# Altium footprint library SILICA_PCBLIB.PcbLib: 161 footprints (part 1 of 11)
Each footprint in its own frame and in the unit in brackets; x right, y up, seen from the top. Pads: shape width x height; smd on the part's side, far side on the other; paste and mask are expansions set on the pad; w line width, h text height; cw(c..) or ccw(c..) is an arc to the next point about the centre after c.
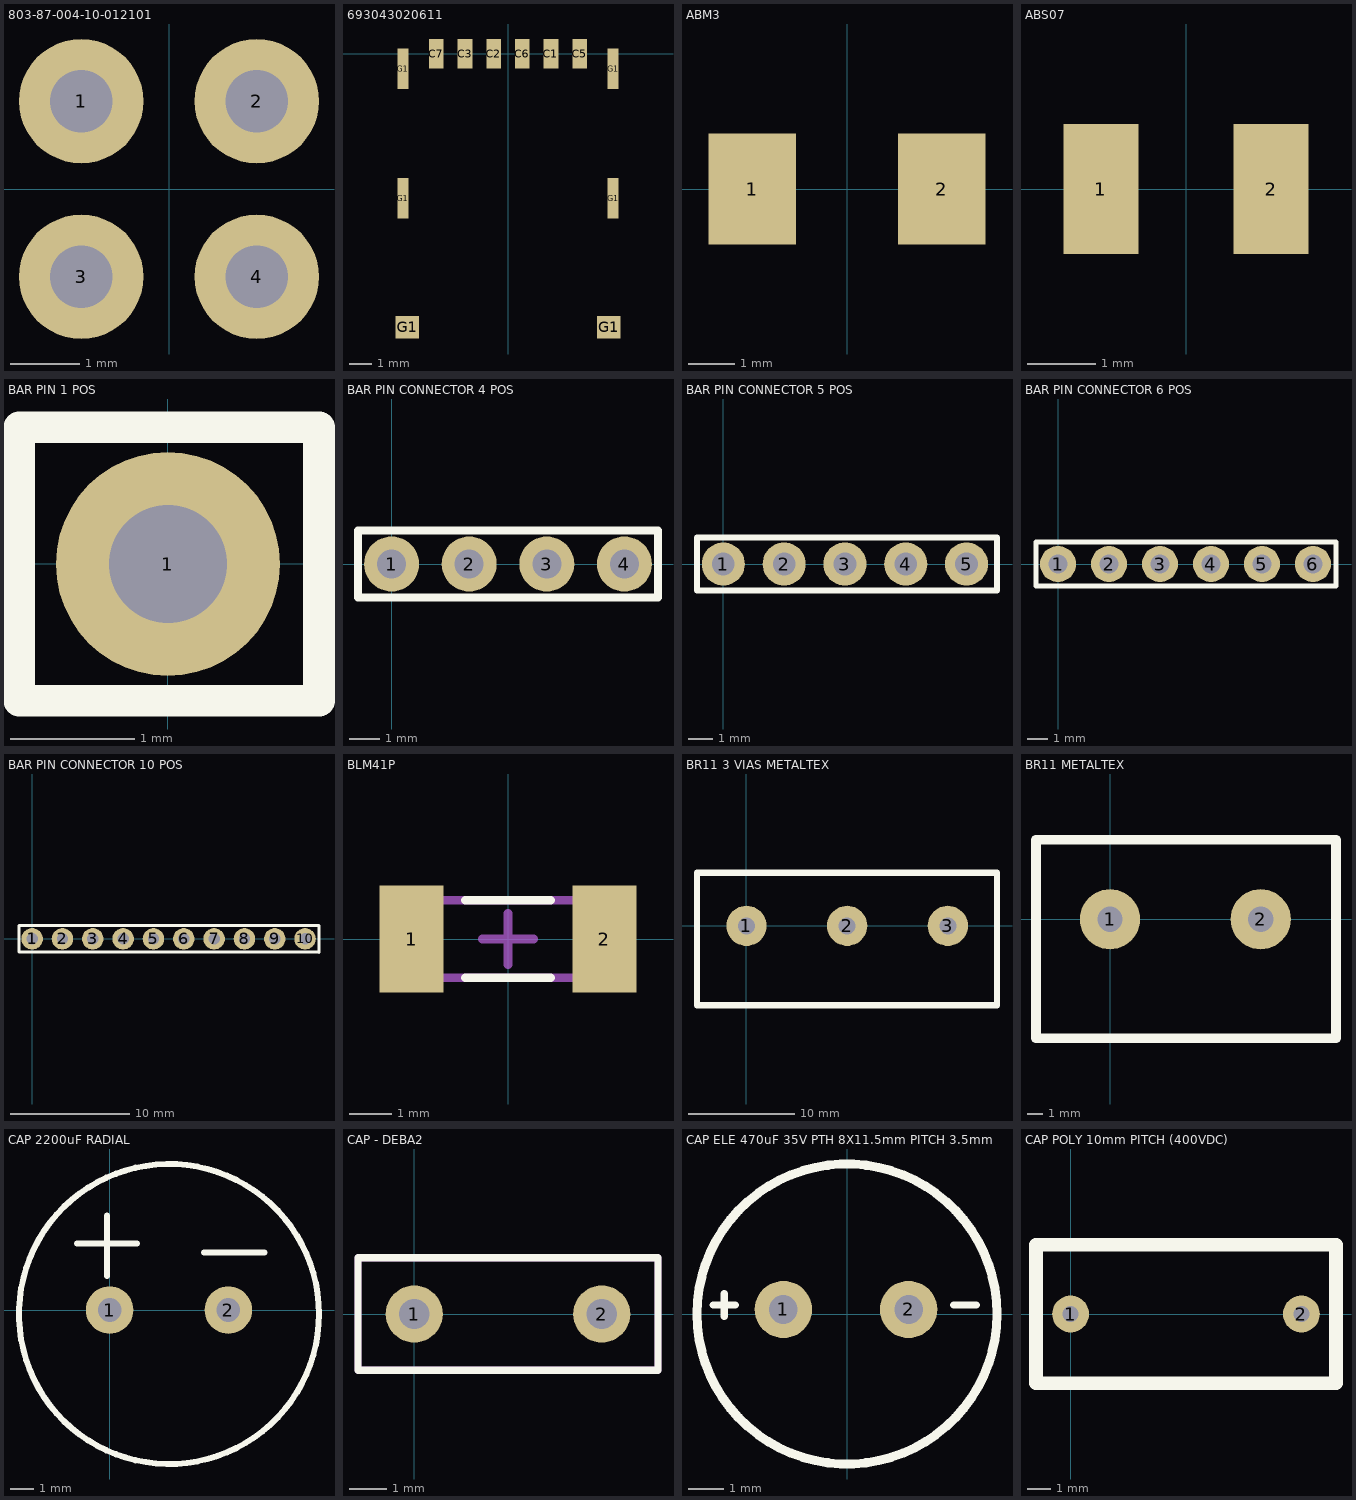
[diagram p0: the footprints below, top view; thin cyan lines are the x and y axes]

## 803-87-004-10-012101 [mm]
pads (4):
  round 1.8 hole 0.9: 1(-1.27,1.27) 2(1.27,1.27) 3(-1.27,-1.27) 4(1.27,-1.27)
3D body "pcb_connector_803-87-004-10-268101.stp": height 2.8, standoff -2.9, extent -2.527,-2.527 2.553,2.553

## 693043020611 [mm] "NANO SIM - PUSH & PULL TYPE - 6 PINS"
height 1.3
pads (12):
  rect 0.65x1.3 smd: C1(1.905,0) C2(-0.635,0) C3(-1.905,0) C5(3.175,0) C6(0.635,0) C7(-3.175,0)
  rect 0.48x1.8 smd: G1(-4.66,-6.42) G1(-4.66,-0.67) G1(4.66,-6.42) G1(4.66,-0.67)
  rect 1.03x1 smd: G1(-4.465,-12.14) G1(4.465,-12.14)
3D body "STEP-693043020611-rev1.stp": height 1.1, standoff -0.11, extent -4.75,-12.388 4.75,0.113

## ABM3 [mm] "MINIATURE CERAMIC SMD CRYSTAL"
height 1.3
pads (2):
  rect 1.9x2.4 smd: 1(-2.05,0) 2(2.05,0)
3D body "ABM3.STEP": height 1.3, standoff 0, extent -2.5,-1.6 2.5,1.6

## ABS07 [mm] "MINIATURE CERAMIC SMD CRYSTAL"
height 0.9
pads (2):
  rect 1.1x1.9 smd: 1(-1.25,0) 2(1.25,0)
3D body "ABS07.STEP": height 0.89, standoff 0, extent -1.6,-0.749 1.6,0.749

## BAR PIN 1 POS [mm] "BAR PIN 1 POS"
pads (1):
  round 1.8 hole 0.95: 1(0,0)
Top Overlay:
  lines w0.254: -1.196,-1.1 -1.196,1.1 1.214,1.1 1.214,-1.1 -1.196,-1.1
3D body: height 0, standoff -2, extent -0.466,-0.469 0.47,0.469
3D body: height 3.9, standoff 0, extent -0.466,-0.469 0.47,0.469
3D body: height 1.5, standoff 0, extent -1.065,-1.2 1.119,1.002

## BAR PIN CONNECTOR 4 POS [mm] "BAR PIN CONNECTOR 4 POS"
pads (4):
  round 1.8 hole 0.95: 1(0,0) 2(2.54,0) 3(5.08,0) 4(7.62,0)
Top Overlay:
  lines w0.254: 8.7,-1.1 -1.1,-1.1 -1.1,1.1 8.72,1.1 8.72,-1.1
3D body: height 3.9, standoff 0, extent 7.144,-0.469 8.08,0.469
3D body: height 1.5, standoff 0, extent 1.475,-1.2 6.215,1
3D body: height 3.9, standoff 0, extent -0.466,-0.469 0.47,0.469
3D body: height 0, standoff -2, extent -0.466,-0.469 0.47,0.469
3D body: height 3.9, standoff 0, extent 2.074,-0.469 3.01,0.469
3D body: height 0, standoff -2, extent 2.074,-0.469 3.01,0.469
3D body: height 0, standoff -2, extent 4.614,-0.469 5.55,0.469
3D body: height 3.9, standoff 0, extent 4.604,-0.469 5.54,0.469
3D body: height 1.5, standoff 0, extent -1.065,-1.2 3.675,1
3D body: height 0, standoff -2, extent 7.154,-0.469 8.09,0.469
3D body: height 1.5, standoff 0, extent 4.015,-1.2 8.755,1

## BAR PIN CONNECTOR 5 POS [mm] "BAR PIN CONNECTOR 6 POS"
pads (5):
  round 1.8 hole 0.95: 1(0,0) 2(2.54,0) 3(5.08,0) 4(7.62,0) 5(10.16,0)
Top Overlay:
  lines w0.254: -1.1,-1.1 11.433,-1.1 11.433,1.1 -1.1,1.1 -1.1,-1.1
3D body: height 3.9, standoff 0, extent 7.144,-0.469 8.08,0.469
3D body: height 1.5, standoff 0, extent 1.475,-1.2 6.215,1
3D body: height 3.9, standoff 0, extent -0.466,-0.469 0.47,0.469
3D body: height 0, standoff -2, extent -0.466,-0.469 0.47,0.469
3D body: height 3.9, standoff 0, extent 2.074,-0.469 3.01,0.469
3D body: height 0, standoff -2, extent 2.074,-0.469 3.01,0.469
3D body: height 0, standoff -2, extent 4.614,-0.469 5.55,0.469
3D body: height 3.9, standoff 0, extent 4.604,-0.469 5.54,0.469
3D body: height 1.5, standoff 0, extent -1.065,-1.2 3.675,1
3D body: height 0, standoff -2, extent 7.154,-0.469 8.09,0.469
3D body: height 0, standoff -2, extent 9.694,-0.469 10.63,0.469
3D body: height 3.9, standoff 0, extent 9.684,-0.469 10.62,0.469
3D body: height 1.5, standoff 0, extent 4.015,-1.2 8.755,1
3D body: height 1.5, standoff 0, extent 6.555,-1.2 11.295,1

## BAR PIN CONNECTOR 6 POS [mm] "BAR PIN CONNECTOR 6 POS"
pads (6):
  round 1.8 hole 0.95: 1(0,0) 2(2.54,0) 3(5.08,0) 4(7.62,0) 5(10.16,0) 6(12.7,0)
Top Overlay:
  lines w0.254: -1.1,-1.1 -1.1,1.1 13.85,1.1 13.85,-1.1 -1.1,-1.1
3D body: height 1.5, standoff 0, extent 6.555,-1.2 11.295,1
3D body: height 1.5, standoff 0, extent 4.015,-1.2 8.755,1
3D body: height 3.9, standoff 0, extent 9.684,-0.469 10.62,0.469
3D body: height 0, standoff -2, extent 9.694,-0.469 10.63,0.469
3D body: height 0, standoff -2, extent 7.154,-0.469 8.09,0.469
3D body: height 1.5, standoff 0, extent -1.065,-1.2 3.675,1
3D body: height 3.9, standoff 0, extent 4.604,-0.469 5.54,0.469
3D body: height 0, standoff -2, extent 4.614,-0.469 5.55,0.469
3D body: height 0, standoff -2, extent 2.074,-0.469 3.01,0.469
3D body: height 3.9, standoff 0, extent 2.074,-0.469 3.01,0.469
3D body: height 0, standoff -2, extent -0.466,-0.469 0.47,0.469
3D body: height 3.9, standoff 0, extent -0.466,-0.469 0.47,0.469
3D body: height 1.5, standoff 0, extent 1.475,-1.2 6.215,1
3D body: height 3.9, standoff 0, extent 7.144,-0.469 8.08,0.469
3D body: height 3.9, standoff 0, extent 12.224,-0.469 13.16,0.469
3D body: height 0, standoff -2, extent 12.234,-0.469 13.17,0.469
3D body: height 1.5, standoff 0, extent 9.095,-1.2 13.835,1

## BAR PIN CONNECTOR 10 POS [mm]
pads (10):
  round 1.8 hole 0.95: 1(0,0) 2(2.54,0) 3(5.08,0) 4(7.62,0) 5(10.16,0) 6(12.7,0) 7(15.24,0) 8(17.78,0) 9(20.32,0) 10(22.86,0)
Top Overlay:
  lines w0.254: 24.025,-1.125 24.025,1.075 ; 24.025,-1.1 -1.1,-1.1 -1.1,1.1 24.025,1.1
3D body: height 1.5, standoff 0, extent 19.255,-1.2 23.995,1
3D body: height 1.5, standoff 0, extent 16.715,-1.2 21.455,1
3D body: height 1.5, standoff 0, extent 14.175,-1.2 18.915,1
3D body: height 1.5, standoff 0, extent 11.635,-1.2 16.375,1
3D body: height 1.5, standoff 0, extent 9.095,-1.2 13.835,1
3D body: height 1.5, standoff 0, extent 6.555,-1.2 11.295,1
3D body: height 1.5, standoff 0, extent 4.015,-1.2 8.755,1
3D body: height 3.9, standoff 0, extent 22.384,-0.469 23.32,0.469
3D body: height 3.9, standoff 0, extent 19.844,-0.469 20.78,0.469
3D body: height 3.9, standoff 0, extent 17.304,-0.469 18.24,0.469
3D body: height 3.9, standoff 0, extent 14.764,-0.469 15.7,0.469
3D body: height 3.9, standoff 0, extent 12.224,-0.469 13.16,0.469
3D body: height 3.9, standoff 0, extent 9.684,-0.469 10.62,0.469
3D body: height 3.9, standoff 0, extent 7.144,-0.469 8.08,0.469
3D body: height 0, standoff -2, extent 22.394,-0.469 23.33,0.469
3D body: height 0, standoff -2, extent 19.854,-0.469 20.79,0.469
3D body: height 0, standoff -2, extent 17.314,-0.469 18.25,0.469
3D body: height 0, standoff -2, extent 14.774,-0.469 15.71,0.469
3D body: height 0, standoff -2, extent 12.234,-0.469 13.17,0.469
3D body: height 0, standoff -2, extent 9.694,-0.469 10.63,0.469
3D body: height 0, standoff -2, extent 7.154,-0.469 8.09,0.469
3D body: height 1.5, standoff 0, extent -1.065,-1.2 3.675,1
3D body: height 3.9, standoff 0, extent 4.604,-0.469 5.54,0.469
3D body: height 0, standoff -2, extent 4.614,-0.469 5.55,0.469
3D body: height 0, standoff -2, extent 2.074,-0.469 3.01,0.469
3D body: height 3.9, standoff 0, extent 2.074,-0.469 3.01,0.469
3D body: height 0, standoff -2, extent -0.466,-0.469 0.47,0.469
3D body: height 3.9, standoff 0, extent -0.466,-0.469 0.47,0.469
3D body: height 1.5, standoff 0, extent 1.475,-1.2 6.215,1

## BLM41P [mm] "EMIFIL chip ferrite bead"
height 1.8
pads (2):
  rect 1.5x2.5 smd paste-0.051 mask+0: 1(-2.25,0) 2(2.25,0)
Top Overlay:
  lines w0.2: -1,-0.9 1,-0.9 ; -1,0.9 1,0.9
Mechanical 13:
  lines w0.2: -2.35,-0.9 -2.35,0.9 2.35,0.9 2.35,-0.9 -2.35,-0.9
Mechanical 15:
  lines w0.2: -0.6,0 0.6,0 ; 0,-0.6 0,0.6 ; -2.35,-0.9 2.35,-0.9 2.35,0.9 -2.35,0.9 -2.35,-0.9
3D body: height 1.4, standoff 0, extent -2.35,-0.9 2.35,0.9

## BR11 3 VIAS METALTEX [mm] "BR11  3 VIAS  METALTEX"
pads (3):
  round 3.8 hole 1.6: 1(0,0) 2(9.5,0) 3(19,0)
Top Overlay:
  lines w0.6: -4.666,-7.5 -4.666,5.007 23.636,5.007 23.636,-7.499 -4.665,-7.499

## BR11 METALTEX [mm] "BR11 METALTEX"
pads (2):
  round 3.8 hole 1.6: 1(0,0) 2(9.5,0)
Top Overlay:
  lines w0.6: -4.666,-7.5 -4.666,5.007 14.245,5.007 ; -4.665,-7.499 14.249,-7.499 ; 14.25,-7.498 14.25,5.002

## CAP 2200uF RADIAL [mm]
pads (2):
  round 2 hole 1: 1(0,0) 2(5,0)
Top Overlay:
  circle w0.254: c2.5,-0.166 r6.321
  lines w0.254: -1.382,2.798 1.152,2.798 ; -0.116,1.446 -0.116,3.98 ; 3.98,2.428 6.514,2.428
3D body "User Library-Capacitor, Al El, Thru Mt, 2200uF, 25V - CDE #SEK222M025ST.STEP": height 25.4, standoff -28.75, extent -4.181,-6.624 9.019,6.576

## CAP - DEBA2 [mil] "High Voltage Ceramic Capacitors (250V-6.3kV)"
height 43.31
pads (2):
  round 60 hole 31.5: 1(0,0) 2(196.85,0)
Top Overlay:
  lines w7.87: -59.06,-59.06 255.91,-59.06 255.91,59.06 -59.06,59.06 -59.06,-59.06
Mechanical 13:
  lines w7.87: -59.06,-59.06 255.91,-59.06 255.91,59.06 -59.06,59.06 -59.06,-59.06
Mechanical 15:
  lines w3.94: -19.69,0 19.68,0 ; 0,-19.69 0,19.68
3D body "User Library-6mm radial ceramic disc capacitor.STEP": height 988.96, standoff -334.65, extent -18.1,-74.8 218.12,74.81

## CAP ELE 470uF 35V PTH 8X11.5mm PITCH 3.5mm [mm]
pads (2):
  round 1.6 hole 0.8: 1(-1.778,0.127) 2(1.722,0.127)
Top Overlay:
  circle w0.254: c0,0 r4.191
  lines w0.2: -3.746,0.254 -3.111,0.254 ; -3.429,-0.064 -3.429,0.572 ; 2.984,0.254 3.619,0.254
3D body "SW3dPS-224-0025.STEP": height 15, standoff -17, extent -4,-3.873 4,4.127

## CAP POLY 10mm PITCH (400VDC) [mm]
pads (2):
  round 1.6 hole 0.7: 1(0,0) 2(10,0)
Top Overlay:
  lines w0.6: -1.5,-3 -1.5,3 5.142,3 11.5,3 11.5,-3 5.142,-3 -1.5,-3
3D body "User Library-Capacitor MKT_B32591C3104 (Pitch 10mm).STEP": height 13.5, standoff -5, extent -1.495,-2.502 11.505,2.498